# Altium schematic symbol library MCU_Microchip_ATmega.SchLib: 440 symbols (part 9 of 9)
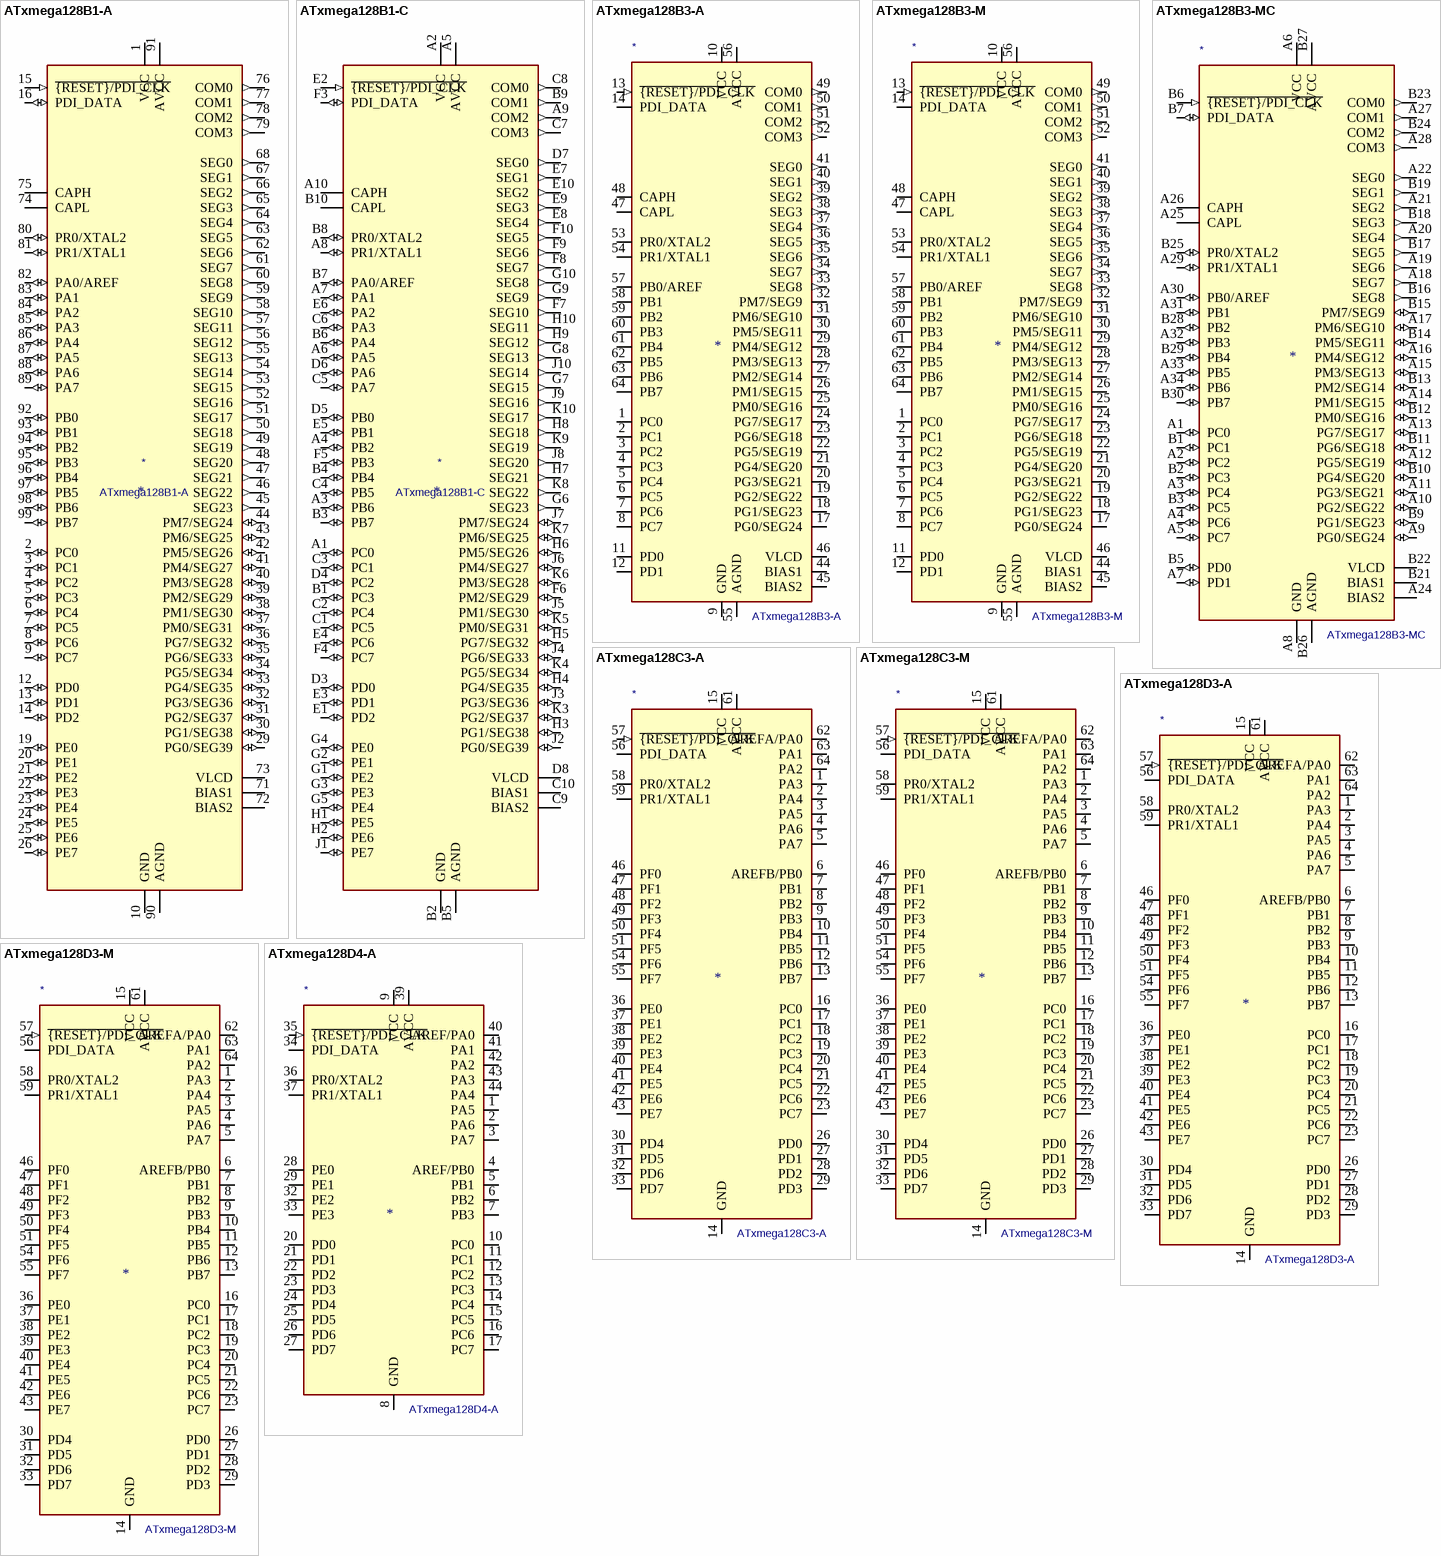
[diagram p48: symbols ATxmega128B1-A to ATxmega128D4-A]

## ATxmega128B3-A
designator *  value ATxmega128B3-A
ki_keywords: AVR 8/16bit Microcontroller XMegaAVR; ki_description: 32MHz, 128kB Flash, 8kB Boot, 8kB SRAM, 2kB EEPROM, JTAG, USB, LCD, TQFP-64; ki_fp_filters: TQFP*14x14mm*P0.8mm*; Footprint: Package_QFP:TQFP-64_14x14mm_P0.8mm; Supplier: http://ww1.microchip.com/downloads/en/DeviceDoc/Atmel-8074-8-and-16-bit-AVR-Microcontroller-XMEGA-B-ATxmega64B3-ATxmega128B3_Datasheet.pdf
footprint TQFP-64_14x14mm_P0.8mm
pins: 1 PC0 (io), 2 PC1 (io), 3 PC2 (io), 4 PC3 (io), 5 PC4 (io), 6 PC5 (io), 7 PC6 (io), 8 PC7 (io), 9 GND (power), 10 VCC (power), 11 PD0 (io), 12 PD1 (io), 13 ~{{RESET}/PDI_CLK} (in), 14 PDI_DATA (io), 15 GND hidden, 16 VCC hidden, 17 PG0/SEG24 (io), 18 PG1/SEG23 (io), 19 PG2/SEG22 (io), 20 PG3/SEG21 (io), 21 PG4/SEG20 (io), 22 PG5/SEG19 (io), 23 PG6/SEG18 (io), 24 PG7/SEG17 (io), 25 PM0/SEG16 (io), 26 PM1/SEG15 (io), 27 PM2/SEG14 (io), 28 PM3/SEG13 (io), 29 PM4/SEG12 (io), 30 PM5/SEG11 (io), 31 PM6/SEG10 (io), 32 PM7/SEG9 (io), 33 SEG8 (out), 34 SEG7 (out), 35 SEG6 (out), 36 SEG5 (out), 37 SEG4 (out), 38 SEG3 (out), 39 SEG2 (out), 40 SEG1 (out), 41 SEG0 (out), 42 GND hidden, 43 VCC hidden, 44 BIAS1 (power), 45 BIAS2 (power), 46 VLCD (power), 47 CAPL, 48 CAPH, 49 COM0 (out), 50 COM1 (out), 51 COM2 (out), 52 COM3 (out), 53 PR0/XTAL2 (io), 54 PR1/XTAL1 (io), 55 AGND (power), 56 AVCC (power), 57 PB0/AREF (io), 58 PB1 (io), 59 PB2 (io), 60 PB3 (io), 61 PB4 (io), 62 PB5 (io), 63 PB6 (io), 64 PB7 (io)

## ATxmega128B3-M
designator *  value ATxmega128B3-M
ki_keywords: AVR 8/16bit Microcontroller XMegaAVR; ki_description: 32MHz, 128kB Flash, 8kB Boot, 8kB SRAM, 2kB EEPROM, JTAG, USB, LCD, QFN-64; ki_fp_filters: QFN*1EP*9x9mm*P0.5mm*; Footprint: Package_DFN_QFN:QFN-64-1EP_9x9mm_P0.5mm_EP7.65x7.65mm; Supplier: http://ww1.microchip.com/downloads/en/DeviceDoc/Atmel-8074-8-and-16-bit-AVR-Microcontroller-XMEGA-B-ATxmega64B3-ATxmega128B3_Datasheet.pdf
footprint QFN-64-1EP_9x9mm_P0.5mm_EP7.65x7.65mm
pins: 1 PC0 (io), 2 PC1 (io), 3 PC2 (io), 4 PC3 (io), 5 PC4 (io), 6 PC5 (io), 7 PC6 (io), 8 PC7 (io), 9 GND (power), 10 VCC (power), 11 PD0 (io), 12 PD1 (io), 13 ~{{RESET}/PDI_CLK} (in), 14 PDI_DATA (io), 15 GND hidden, 16 VCC hidden, 17 PG0/SEG24 (io), 18 PG1/SEG23 (io), 19 PG2/SEG22 (io), 20 PG3/SEG21 (io), 21 PG4/SEG20 (io), 22 PG5/SEG19 (io), 23 PG6/SEG18 (io), 24 PG7/SEG17 (io), 25 PM0/SEG16 (io), 26 PM1/SEG15 (io), 27 PM2/SEG14 (io), 28 PM3/SEG13 (io), 29 PM4/SEG12 (io), 30 PM5/SEG11 (io), 31 PM6/SEG10 (io), 32 PM7/SEG9 (io), 33 SEG8 (out), 34 SEG7 (out), 35 SEG6 (out), 36 SEG5 (out), 37 SEG4 (out), 38 SEG3 (out), 39 SEG2 (out), 40 SEG1 (out), 41 SEG0 (out), 42 GND hidden, 43 VCC hidden, 44 BIAS1 (power), 45 BIAS2 (power), 46 VLCD (power), 47 CAPL, 48 CAPH, 49 COM0 (out), 50 COM1 (out), 51 COM2 (out), 52 COM3 (out), 53 PR0/XTAL2 (io), 54 PR1/XTAL1 (io), 55 AGND (power), 56 AVCC (power), 57 PB0/AREF (io), 58 PB1 (io), 59 PB2 (io), 60 PB3 (io), 61 PB4 (io), 62 PB5 (io), 63 PB6 (io), 64 PB7 (io), 65 GND hidden

## ATxmega128B3-MC
designator *  value ATxmega128B3-MC
ki_keywords: AVR 8/16bit Microcontroller XMegaAVR; ki_description: 32MHz, 128kB Flash, 8kB Boot, 8kB SRAM, 2kB EEPROM, JTAG, USB, LCD, DRQFN-64; ki_fp_filters: Microchip*DRQFN*1EP*7x7mm*P0.65mm*; Footprint: Package_DFN_QFN:Microchip_DRQFN-64-1EP_7x7mm_P0.65mm_EP4.1x4.1mm; Supplier: http://ww1.microchip.com/downloads/en/DeviceDoc/Atmel-8074-8-and-16-bit-AVR-Microcontroller-XMEGA-B-ATxmega64B3-ATxmega128B3_Datasheet.pdf
footprint Microchip_DRQFN-64-1EP_7x7mm_P0.65mm_EP4.1x4.1mm
pins: A1 PC0 (io), A2 PC2 (io), A3 PC4 (io), A4 PC6 (io), A5 PC7 (io), A6 VCC (power), A7 PD1 (io), A8 GND (power), A9 PG0/SEG24 (io), A10 PG2/SEG22 (io), A11 PG3/SEG21 (io), A12 PG5/SEG19 (io), A13 PG7/SEG17 (io), A14 PM1/SEG15 (io), A15 PM3/SEG13 (io), A16 PM4/SEG12 (io), A17 PM6/SEG10 (io), A18 SEG7 (out), A19 SEG6 (out), A20 SEG4 (out), A21 SEG2 (out), A22 SEG0 (out), A23 VCC hidden, A24 BIAS2 (power), A25 CAPL, A26 CAPH, A27 COM1 (out), A28 COM3 (out), A29 PR1/XTAL1 (io), A30 PB0/AREF (io), A31 PB1 (io), A32 PB3 (io), A33 PB5 (io), A34 PB6 (io), B1 PC1 (io), B2 PC3 (io), B3 PC5 (io), B4 GND hidden, B5 PD0 (io), B6 ~{{RESET}/PDI_CLK} (in), B7 PDI_DATA (io), B8 VCC hidden, B9 PG1/SEG23 (io), B10 PG4/SEG20 (io), B11 PG6/SEG18 (io), B12 PM0/SEG16 (io), B13 PM2/SEG14 (io), B14 PM5/SEG11 (io), B15 PM7/SEG9 (io), B16 SEG8 (out), B17 SEG5 (out), B18 SEG3 (out), B19 SEG1 (out), B20 GND hidden, B21 BIAS1 (power), B22 VLCD (power), B23 COM0 (out), B24 COM2 (out), B25 PR0/XTAL2 (io), B26 AGND (power), B27 AVCC (power), B28 PB2 (io), B29 PB4 (io), B30 PB7 (io), EP GND hidden

## ATxmega128C3-A
designator *  value ATxmega128C3-A
ki_keywords: AVR 8/16bit Microcontroller XMegaAVR; ki_description: 32MHz, 128kB Flash, 8kB Boot, 8kB SRAM, 2kB EEPROM, JTAG, USB, TQFP-64; ki_fp_filters: TQFP*14x14mm*P0.8mm*; Footprint: Package_QFP:TQFP-64_14x14mm_P0.8mm; Supplier: http://ww1.microchip.com/downloads/en/DeviceDoc/Atmel-8492-8-and-16-bit-AVR-microcontroller-ATxmega32C3_64C3_128C3_192C3_256C3_datasheet.pdf
footprint TQFP-64_14x14mm_P0.8mm
pins: 1 PA3 (io), 2 PA4 (io), 3 PA5 (io), 4 PA6 (io), 5 PA7 (io), 6 AREFB/PB0 (io), 7 PB1 (io), 8 PB2 (io), 9 PB3 (io), 10 PB4 (io), 11 PB5 (io), 12 PB6 (io), 13 PB7 (io), 14 GND (power), 15 VCC (power), 16 PC0 (io), 17 PC1 (io), 18 PC2 (io), 19 PC3 (io), 20 PC4 (io), 21 PC5 (io), 22 PC6 (io), 23 PC7 (io), 24 GND hidden, 25 VCC hidden, 26 PD0 (io), 27 PD1 (io), 28 PD2 (io), 29 PD3 (io), 30 PD4 (io), 31 PD5 (io), 32 PD6 (io), 33 PD7 (io), 34 GND hidden, 35 VCC hidden, 36 PE0 (io), 37 PE1 (io), 38 PE2 (io), 39 PE3 (io), 40 PE4 (io), 41 PE5 (io), 42 PE6 (io), 43 PE7 (io), 44 GND hidden, 45 VCC hidden, 46 PF0 (io), 47 PF1 (io), 48 PF2 (io), 49 PF3 (io), 50 PF4 (io), 51 PF5 (io), 52 GND hidden, 53 VCC hidden, 54 PF6 (io), 55 PF7 (io), 56 PDI_DATA (io), 57 ~{{RESET}/PDI_CLK} (in), 58 PR0/XTAL2 (io), 59 PR1/XTAL1 (io), 60 GND hidden, 61 AVCC (power), 62 AREFA/PA0 (io), 63 PA1 (io), 64 PA2 (io)

## ATxmega128C3-M
designator *  value ATxmega128C3-M
ki_keywords: AVR 8/16bit Microcontroller XMegaAVR; ki_description: 32MHz, 128kB Flash, 8kB Boot, 8kB SRAM, 2kB EEPROM, JTAG, USB, QFN-64; ki_fp_filters: QFN*1EP*9x9mm*P0.5mm*; Footprint: Package_DFN_QFN:QFN-64-1EP_9x9mm_P0.5mm_EP7.65x7.65mm; Supplier: http://ww1.microchip.com/downloads/en/DeviceDoc/Atmel-8492-8-and-16-bit-AVR-microcontroller-ATxmega32C3_64C3_128C3_192C3_256C3_datasheet.pdf
footprint QFN-64-1EP_9x9mm_P0.5mm_EP7.65x7.65mm
pins: 1 PA3 (io), 2 PA4 (io), 3 PA5 (io), 4 PA6 (io), 5 PA7 (io), 6 AREFB/PB0 (io), 7 PB1 (io), 8 PB2 (io), 9 PB3 (io), 10 PB4 (io), 11 PB5 (io), 12 PB6 (io), 13 PB7 (io), 14 GND (power), 15 VCC (power), 16 PC0 (io), 17 PC1 (io), 18 PC2 (io), 19 PC3 (io), 20 PC4 (io), 21 PC5 (io), 22 PC6 (io), 23 PC7 (io), 24 GND hidden, 25 VCC hidden, 26 PD0 (io), 27 PD1 (io), 28 PD2 (io), 29 PD3 (io), 30 PD4 (io), 31 PD5 (io), 32 PD6 (io), 33 PD7 (io), 34 GND hidden, 35 VCC hidden, 36 PE0 (io), 37 PE1 (io), 38 PE2 (io), 39 PE3 (io), 40 PE4 (io), 41 PE5 (io), 42 PE6 (io), 43 PE7 (io), 44 GND hidden, 45 VCC hidden, 46 PF0 (io), 47 PF1 (io), 48 PF2 (io), 49 PF3 (io), 50 PF4 (io), 51 PF5 (io), 52 GND hidden, 53 VCC hidden, 54 PF6 (io), 55 PF7 (io), 56 PDI_DATA (io), 57 ~{{RESET}/PDI_CLK} (in), 58 PR0/XTAL2 (io), 59 PR1/XTAL1 (io), 60 GND hidden, 61 AVCC (power), 62 AREFA/PA0 (io), 63 PA1 (io), 64 PA2 (io), 65 GND hidden

## ATxmega128D3-A
designator *  value ATxmega128D3-A
ki_keywords: AVR 8/16bit Microcontroller XMegaAVR; ki_description: 32MHz, 128kB Flash, 8kB Boot, 8kB SRAM, 2kB EEPROM, JTAG, TQFP-64; ki_fp_filters: TQFP*14x14mm*P0.8mm*; Footprint: Package_QFP:TQFP-64_14x14mm_P0.8mm; Supplier: http://ww1.microchip.com/downloads/en/DeviceDoc/Atmel-8134-8-16-bit-Atmel-XMEGA-D3-Microcontroller_Datasheet.pdf
footprint TQFP-64_14x14mm_P0.8mm
pins: 1 PA3 (io), 2 PA4 (io), 3 PA5 (io), 4 PA6 (io), 5 PA7 (io), 6 AREFB/PB0 (io), 7 PB1 (io), 8 PB2 (io), 9 PB3 (io), 10 PB4 (io), 11 PB5 (io), 12 PB6 (io), 13 PB7 (io), 14 GND (power), 15 VCC (power), 16 PC0 (io), 17 PC1 (io), 18 PC2 (io), 19 PC3 (io), 20 PC4 (io), 21 PC5 (io), 22 PC6 (io), 23 PC7 (io), 24 GND hidden, 25 VCC hidden, 26 PD0 (io), 27 PD1 (io), 28 PD2 (io), 29 PD3 (io), 30 PD4 (io), 31 PD5 (io), 32 PD6 (io), 33 PD7 (io), 34 GND hidden, 35 VCC hidden, 36 PE0 (io), 37 PE1 (io), 38 PE2 (io), 39 PE3 (io), 40 PE4 (io), 41 PE5 (io), 42 PE6 (io), 43 PE7 (io), 44 GND hidden, 45 VCC hidden, 46 PF0 (io), 47 PF1 (io), 48 PF2 (io), 49 PF3 (io), 50 PF4 (io), 51 PF5 (io), 52 GND hidden, 53 VCC hidden, 54 PF6 (io), 55 PF7 (io), 56 PDI_DATA (io), 57 ~{{RESET}/PDI_CLK} (in), 58 PR0/XTAL2 (io), 59 PR1/XTAL1 (io), 60 GND hidden, 61 AVCC (power), 62 AREFA/PA0 (io), 63 PA1 (io), 64 PA2 (io)

## ATxmega128D3-M
designator *  value ATxmega128D3-M
ki_keywords: AVR 8/16bit Microcontroller XMegaAVR; ki_description: 32MHz, 128kB Flash, 8kB Boot, 8kB SRAM, 2kB EEPROM, JTAG, QFN-64; ki_fp_filters: QFN*1EP*9x9mm*P0.5mm*; Footprint: Package_DFN_QFN:QFN-64-1EP_9x9mm_P0.5mm_EP7.65x7.65mm; Supplier: http://ww1.microchip.com/downloads/en/DeviceDoc/Atmel-8134-8-16-bit-Atmel-XMEGA-D3-Microcontroller_Datasheet.pdf
footprint QFN-64-1EP_9x9mm_P0.5mm_EP7.65x7.65mm
pins: 1 PA3 (io), 2 PA4 (io), 3 PA5 (io), 4 PA6 (io), 5 PA7 (io), 6 AREFB/PB0 (io), 7 PB1 (io), 8 PB2 (io), 9 PB3 (io), 10 PB4 (io), 11 PB5 (io), 12 PB6 (io), 13 PB7 (io), 14 GND (power), 15 VCC (power), 16 PC0 (io), 17 PC1 (io), 18 PC2 (io), 19 PC3 (io), 20 PC4 (io), 21 PC5 (io), 22 PC6 (io), 23 PC7 (io), 24 GND hidden, 25 VCC hidden, 26 PD0 (io), 27 PD1 (io), 28 PD2 (io), 29 PD3 (io), 30 PD4 (io), 31 PD5 (io), 32 PD6 (io), 33 PD7 (io), 34 GND hidden, 35 VCC hidden, 36 PE0 (io), 37 PE1 (io), 38 PE2 (io), 39 PE3 (io), 40 PE4 (io), 41 PE5 (io), 42 PE6 (io), 43 PE7 (io), 44 GND hidden, 45 VCC hidden, 46 PF0 (io), 47 PF1 (io), 48 PF2 (io), 49 PF3 (io), 50 PF4 (io), 51 PF5 (io), 52 GND hidden, 53 VCC hidden, 54 PF6 (io), 55 PF7 (io), 56 PDI_DATA (io), 57 ~{{RESET}/PDI_CLK} (in), 58 PR0/XTAL2 (io), 59 PR1/XTAL1 (io), 60 GND hidden, 61 AVCC (power), 62 AREFA/PA0 (io), 63 PA1 (io), 64 PA2 (io), 65 GND hidden

## ATxmega128D4-A
designator *  value ATxmega128D4-A
ki_keywords: AVR 8/16bit Microcontroller XMegaAVR; ki_description: 32MHz, 128kB Flash, 8kB Boot, 8kB SRAM, 2kB EEPROM, JTAG, TQFP-44; ki_fp_filters: TQFP*10x10mm*P0.8mm*; Footprint: Package_QFP:TQFP-44_10x10mm_P0.8mm; Supplier: http://ww1.microchip.com/downloads/en/DeviceDoc/Atmel-8135-8-and-16-bit-AVR-microcontroller-ATxmega16D4-32D4-64D4-128D4_datasheet.pdf
footprint TQFP-44_10x10mm_P0.8mm
pins: 1 PA5 (io), 2 PA6 (io), 3 PA7 (io), 4 AREF/PB0 (io), 5 PB1 (io), 6 PB2 (io), 7 PB3 (io), 8 GND (power), 9 VCC (power), 10 PC0 (io), 11 PC1 (io), 12 PC2 (io), 13 PC3 (io), 14 PC4 (io), 15 PC5 (io), 16 PC6 (io), 17 PC7 (io), 18 GND hidden, 19 VCC hidden, 20 PD0 (io), 21 PD1 (io), 22 PD2 (io), 23 PD3 (io), 24 PD4 (io), 25 PD5 (io), 26 PD6 (io), 27 PD7 (io), 28 PE0 (io), 29 PE1 (io), 30 GND hidden, 31 VCC hidden, 32 PE2 (io), 33 PE3 (io), 34 PDI_DATA (io), 35 ~{{RESET}/PDI_CLK} (in), 36 PR0/XTAL2 (io), 37 PR1/XTAL1 (io), 38 GND hidden, 39 AVCC (power), 40 AREF/PA0 (io), 41 PA1 (io), 42 PA2 (io), 43 PA3 (io), 44 PA4 (io)

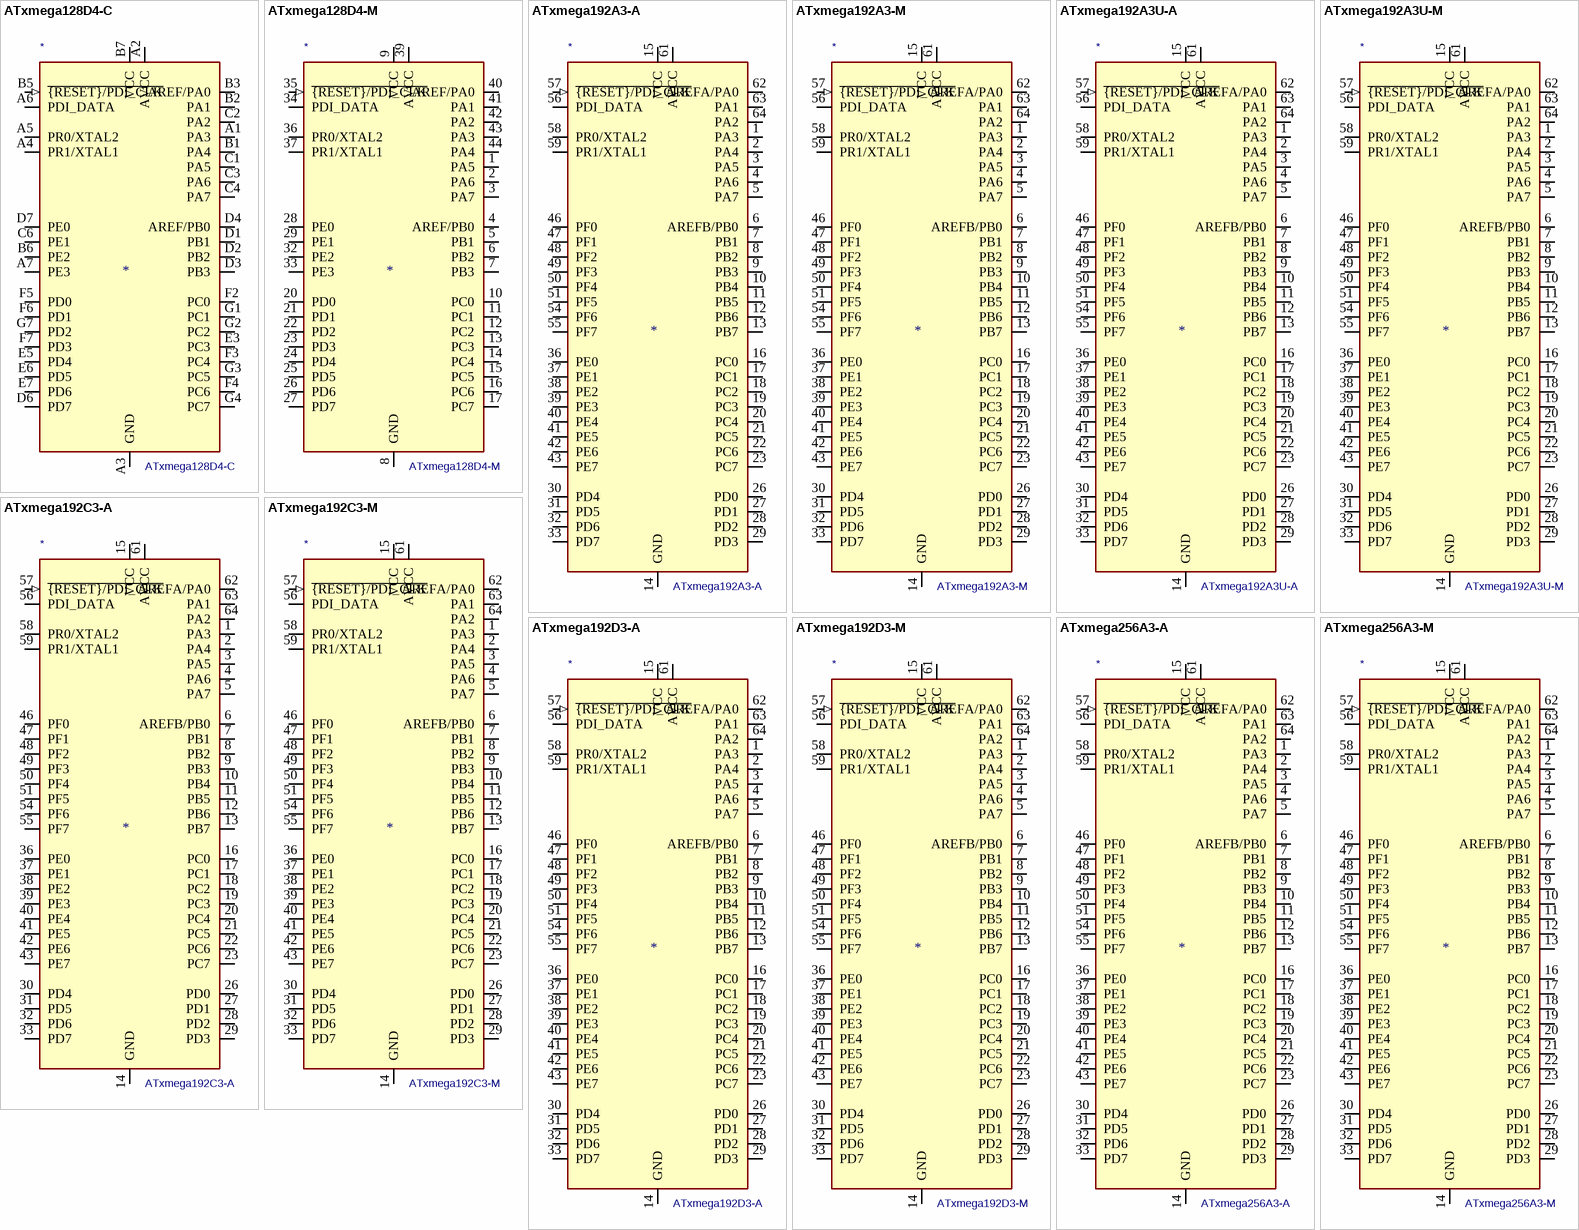
[diagram p38: symbols ATxmega128D4-C to ATxmega256A3-M]

## ATxmega128D4-C
designator *  value ATxmega128D4-C
ki_keywords: AVR 8/16bit Microcontroller XMegaAVR; ki_description: 32MHz, 128kB Flash, 8kB Boot, 8kB SRAM, 2kB EEPROM, JTAG, VFBGA-49; ki_fp_filters: VFBGA*5.0x5.0mm*Layout7x7*P0.65mm*; Footprint: Package_BGA:VFBGA-49_5.0x5.0mm_Layout7x7_P0.65mm; Supplier: http://ww1.microchip.com/downloads/en/DeviceDoc/Atmel-8135-8-and-16-bit-AVR-microcontroller-ATxmega16D4-32D4-64D4-128D4_datasheet.pdf
footprint VFBGA-49_5.0x5.0mm_Layout7x7_P0.65mm
pins: A1 PA3 (io), A2 AVCC (power), A3 GND (power), A4 PR1/XTAL1 (io), A5 PR0/XTAL2 (io), A6 PDI_DATA (io), A7 PE3 (io), B1 PA4 (io), B2 PA1 (io), B3 AREF/PA0 (io), B4 GND hidden, B5 ~{{RESET}/PDI_CLK} (in), B6 PE2 (io), B7 VCC (power), C1 PA5 (io), C2 PA2 (io), C3 PA6 (io), C4 PA7 (io), C5 GND hidden, C6 PE1 (io), C7 GND hidden, D1 PB1 (io), D2 PB2 (io), D3 PB3 (io), D4 AREF/PB0 (io), D5 GND hidden, D6 PD7 (io), D7 PE0 (io), E1 GND hidden, E2 GND hidden, E3 PC3 (io), E4 GND hidden, E5 PD4 (io), E6 PD5 (io), E7 PD6 (io), F1 VCC hidden, F2 PC0 (io), F3 PC4 (io), F4 PC6 (io), F5 PD0 (io), F6 PD1 (io), F7 PD3 (io), G1 PC1 (io), G2 PC2 (io), G3 PC5 (io), G4 PC7 (io), G5 GND hidden, G6 VCC hidden, G7 PD2 (io)

## ATxmega128D4-M
designator *  value ATxmega128D4-M
ki_keywords: AVR 8/16bit Microcontroller XMegaAVR; ki_description: 32MHz, 128kB Flash, 8kB Boot, 8kB SRAM, 2kB EEPROM, JTAG, QFN-44; ki_fp_filters: QFN*1EP*7x7mm*P0.5mm*; Footprint: Package_DFN_QFN:QFN-44-1EP_7x7mm_P0.5mm_EP5.2x5.2mm; Supplier: http://ww1.microchip.com/downloads/en/DeviceDoc/Atmel-8135-8-and-16-bit-AVR-microcontroller-ATxmega16D4-32D4-64D4-128D4_datasheet.pdf
footprint QFN-44-1EP_7x7mm_P0.5mm_EP5.2x5.2mm
pins: 1 PA5 (io), 2 PA6 (io), 3 PA7 (io), 4 AREF/PB0 (io), 5 PB1 (io), 6 PB2 (io), 7 PB3 (io), 8 GND (power), 9 VCC (power), 10 PC0 (io), 11 PC1 (io), 12 PC2 (io), 13 PC3 (io), 14 PC4 (io), 15 PC5 (io), 16 PC6 (io), 17 PC7 (io), 18 GND hidden, 19 VCC hidden, 20 PD0 (io), 21 PD1 (io), 22 PD2 (io), 23 PD3 (io), 24 PD4 (io), 25 PD5 (io), 26 PD6 (io), 27 PD7 (io), 28 PE0 (io), 29 PE1 (io), 30 GND hidden, 31 VCC hidden, 32 PE2 (io), 33 PE3 (io), 34 PDI_DATA (io), 35 ~{{RESET}/PDI_CLK} (in), 36 PR0/XTAL2 (io), 37 PR1/XTAL1 (io), 38 GND hidden, 39 AVCC (power), 40 AREF/PA0 (io), 41 PA1 (io), 42 PA2 (io), 43 PA3 (io), 44 PA4 (io), 45 GND hidden

## ATxmega192A3-A
designator *  value ATxmega192A3-A
ki_keywords: AVR 8/16bit Microcontroller XMegaAVR; ki_description: 32MHz, 192kB Flash, 8kB Boot, 16kB SRAM, 2kB EEPROM, JTAG, TQFP-64; ki_fp_filters: TQFP*14x14mm*P0.8mm*; Footprint: Package_QFP:TQFP-64_14x14mm_P0.8mm; Supplier: http://ww1.microchip.com/downloads/en/DeviceDoc/Atmel-8068-8-and16-bit-AVR-XMEGA-A3-Microcontrollers_Datasheet.pdf
footprint TQFP-64_14x14mm_P0.8mm
pins: 1 PA3 (io), 2 PA4 (io), 3 PA5 (io), 4 PA6 (io), 5 PA7 (io), 6 AREFB/PB0 (io), 7 PB1 (io), 8 PB2 (io), 9 PB3 (io), 10 PB4 (io), 11 PB5 (io), 12 PB6 (io), 13 PB7 (io), 14 GND (power), 15 VCC (power), 16 PC0 (io), 17 PC1 (io), 18 PC2 (io), 19 PC3 (io), 20 PC4 (io), 21 PC5 (io), 22 PC6 (io), 23 PC7 (io), 24 GND hidden, 25 VCC hidden, 26 PD0 (io), 27 PD1 (io), 28 PD2 (io), 29 PD3 (io), 30 PD4 (io), 31 PD5 (io), 32 PD6 (io), 33 PD7 (io), 34 GND hidden, 35 VCC hidden, 36 PE0 (io), 37 PE1 (io), 38 PE2 (io), 39 PE3 (io), 40 PE4 (io), 41 PE5 (io), 42 PE6 (io), 43 PE7 (io), 44 GND hidden, 45 VCC hidden, 46 PF0 (io), 47 PF1 (io), 48 PF2 (io), 49 PF3 (io), 50 PF4 (io), 51 PF5 (io), 52 GND hidden, 53 VCC hidden, 54 PF6 (io), 55 PF7 (io), 56 PDI_DATA (io), 57 ~{{RESET}/PDI_CLK} (in), 58 PR0/XTAL2 (io), 59 PR1/XTAL1 (io), 60 GND hidden, 61 AVCC (power), 62 AREFA/PA0 (io), 63 PA1 (io), 64 PA2 (io)

## ATxmega192A3-M
designator *  value ATxmega192A3-M
ki_keywords: AVR 8/16bit Microcontroller XMegaAVR; ki_description: 32MHz, 192kB Flash, 8kB Boot, 16kB SRAM, 2kB EEPROM, JTAG, QFN-64; ki_fp_filters: QFN*1EP*9x9mm*P0.5mm*; Footprint: Package_DFN_QFN:QFN-64-1EP_9x9mm_P0.5mm_EP7.65x7.65mm; Supplier: http://ww1.microchip.com/downloads/en/DeviceDoc/Atmel-8068-8-and16-bit-AVR-XMEGA-A3-Microcontrollers_Datasheet.pdf
footprint QFN-64-1EP_9x9mm_P0.5mm_EP7.65x7.65mm
pins: 1 PA3 (io), 2 PA4 (io), 3 PA5 (io), 4 PA6 (io), 5 PA7 (io), 6 AREFB/PB0 (io), 7 PB1 (io), 8 PB2 (io), 9 PB3 (io), 10 PB4 (io), 11 PB5 (io), 12 PB6 (io), 13 PB7 (io), 14 GND (power), 15 VCC (power), 16 PC0 (io), 17 PC1 (io), 18 PC2 (io), 19 PC3 (io), 20 PC4 (io), 21 PC5 (io), 22 PC6 (io), 23 PC7 (io), 24 GND hidden, 25 VCC hidden, 26 PD0 (io), 27 PD1 (io), 28 PD2 (io), 29 PD3 (io), 30 PD4 (io), 31 PD5 (io), 32 PD6 (io), 33 PD7 (io), 34 GND hidden, 35 VCC hidden, 36 PE0 (io), 37 PE1 (io), 38 PE2 (io), 39 PE3 (io), 40 PE4 (io), 41 PE5 (io), 42 PE6 (io), 43 PE7 (io), 44 GND hidden, 45 VCC hidden, 46 PF0 (io), 47 PF1 (io), 48 PF2 (io), 49 PF3 (io), 50 PF4 (io), 51 PF5 (io), 52 GND hidden, 53 VCC hidden, 54 PF6 (io), 55 PF7 (io), 56 PDI_DATA (io), 57 ~{{RESET}/PDI_CLK} (in), 58 PR0/XTAL2 (io), 59 PR1/XTAL1 (io), 60 GND hidden, 61 AVCC (power), 62 AREFA/PA0 (io), 63 PA1 (io), 64 PA2 (io), 65 GND hidden

## ATxmega192A3U-A
designator *  value ATxmega192A3U-A
ki_keywords: AVR 8/16bit Microcontroller XMegaAVR; ki_description: 32MHz, 192kB Flash, 8kB Boot, 16kB SRAM, 2kB EEPROM, JTAG, USB, TQFP-64; ki_fp_filters: TQFP*14x14mm*P0.8mm*; Footprint: Package_QFP:TQFP-64_14x14mm_P0.8mm; Supplier: http://ww1.microchip.com/downloads/en/DeviceDoc/Atmel-8386-8-and-16-bit-AVR-Microcontroller-ATxmega64A3U-128A3U-192A3U-256A3U_datasheet.pdf
footprint TQFP-64_14x14mm_P0.8mm
pins: 1 PA3 (io), 2 PA4 (io), 3 PA5 (io), 4 PA6 (io), 5 PA7 (io), 6 AREFB/PB0 (io), 7 PB1 (io), 8 PB2 (io), 9 PB3 (io), 10 PB4 (io), 11 PB5 (io), 12 PB6 (io), 13 PB7 (io), 14 GND (power), 15 VCC (power), 16 PC0 (io), 17 PC1 (io), 18 PC2 (io), 19 PC3 (io), 20 PC4 (io), 21 PC5 (io), 22 PC6 (io), 23 PC7 (io), 24 GND hidden, 25 VCC hidden, 26 PD0 (io), 27 PD1 (io), 28 PD2 (io), 29 PD3 (io), 30 PD4 (io), 31 PD5 (io), 32 PD6 (io), 33 PD7 (io), 34 GND hidden, 35 VCC hidden, 36 PE0 (io), 37 PE1 (io), 38 PE2 (io), 39 PE3 (io), 40 PE4 (io), 41 PE5 (io), 42 PE6 (io), 43 PE7 (io), 44 GND hidden, 45 VCC hidden, 46 PF0 (io), 47 PF1 (io), 48 PF2 (io), 49 PF3 (io), 50 PF4 (io), 51 PF5 (io), 52 GND hidden, 53 VCC hidden, 54 PF6 (io), 55 PF7 (io), 56 PDI_DATA (io), 57 ~{{RESET}/PDI_CLK} (in), 58 PR0/XTAL2 (io), 59 PR1/XTAL1 (io), 60 GND hidden, 61 AVCC (power), 62 AREFA/PA0 (io), 63 PA1 (io), 64 PA2 (io)

## ATxmega192A3U-M
designator *  value ATxmega192A3U-M
ki_keywords: AVR 8/16bit Microcontroller XMegaAVR; ki_description: 32MHz, 192kB Flash, 8kB Boot, 16kB SRAM, 2kB EEPROM, JTAG, USB, QFN-64; ki_fp_filters: QFN*1EP*9x9mm*P0.5mm*; Footprint: Package_DFN_QFN:QFN-64-1EP_9x9mm_P0.5mm_EP7.65x7.65mm; Supplier: http://ww1.microchip.com/downloads/en/DeviceDoc/Atmel-8386-8-and-16-bit-AVR-Microcontroller-ATxmega64A3U-128A3U-192A3U-256A3U_datasheet.pdf
footprint QFN-64-1EP_9x9mm_P0.5mm_EP7.65x7.65mm
pins: 1 PA3 (io), 2 PA4 (io), 3 PA5 (io), 4 PA6 (io), 5 PA7 (io), 6 AREFB/PB0 (io), 7 PB1 (io), 8 PB2 (io), 9 PB3 (io), 10 PB4 (io), 11 PB5 (io), 12 PB6 (io), 13 PB7 (io), 14 GND (power), 15 VCC (power), 16 PC0 (io), 17 PC1 (io), 18 PC2 (io), 19 PC3 (io), 20 PC4 (io), 21 PC5 (io), 22 PC6 (io), 23 PC7 (io), 24 GND hidden, 25 VCC hidden, 26 PD0 (io), 27 PD1 (io), 28 PD2 (io), 29 PD3 (io), 30 PD4 (io), 31 PD5 (io), 32 PD6 (io), 33 PD7 (io), 34 GND hidden, 35 VCC hidden, 36 PE0 (io), 37 PE1 (io), 38 PE2 (io), 39 PE3 (io), 40 PE4 (io), 41 PE5 (io), 42 PE6 (io), 43 PE7 (io), 44 GND hidden, 45 VCC hidden, 46 PF0 (io), 47 PF1 (io), 48 PF2 (io), 49 PF3 (io), 50 PF4 (io), 51 PF5 (io), 52 GND hidden, 53 VCC hidden, 54 PF6 (io), 55 PF7 (io), 56 PDI_DATA (io), 57 ~{{RESET}/PDI_CLK} (in), 58 PR0/XTAL2 (io), 59 PR1/XTAL1 (io), 60 GND hidden, 61 AVCC (power), 62 AREFA/PA0 (io), 63 PA1 (io), 64 PA2 (io), 65 GND hidden

## ATxmega192C3-A
designator *  value ATxmega192C3-A
ki_keywords: AVR 8/16bit Microcontroller XMegaAVR; ki_description: 32MHz, 192kB Flash, 8kB Boot, 16kB SRAM, 2kB EEPROM, JTAG, USB, TQFP-64; ki_fp_filters: TQFP*14x14mm*P0.8mm*; Footprint: Package_QFP:TQFP-64_14x14mm_P0.8mm; Supplier: http://ww1.microchip.com/downloads/en/DeviceDoc/Atmel-8492-8-and-16-bit-AVR-microcontroller-ATxmega32C3_64C3_128C3_192C3_256C3_datasheet.pdf
footprint TQFP-64_14x14mm_P0.8mm
pins: 1 PA3 (io), 2 PA4 (io), 3 PA5 (io), 4 PA6 (io), 5 PA7 (io), 6 AREFB/PB0 (io), 7 PB1 (io), 8 PB2 (io), 9 PB3 (io), 10 PB4 (io), 11 PB5 (io), 12 PB6 (io), 13 PB7 (io), 14 GND (power), 15 VCC (power), 16 PC0 (io), 17 PC1 (io), 18 PC2 (io), 19 PC3 (io), 20 PC4 (io), 21 PC5 (io), 22 PC6 (io), 23 PC7 (io), 24 GND hidden, 25 VCC hidden, 26 PD0 (io), 27 PD1 (io), 28 PD2 (io), 29 PD3 (io), 30 PD4 (io), 31 PD5 (io), 32 PD6 (io), 33 PD7 (io), 34 GND hidden, 35 VCC hidden, 36 PE0 (io), 37 PE1 (io), 38 PE2 (io), 39 PE3 (io), 40 PE4 (io), 41 PE5 (io), 42 PE6 (io), 43 PE7 (io), 44 GND hidden, 45 VCC hidden, 46 PF0 (io), 47 PF1 (io), 48 PF2 (io), 49 PF3 (io), 50 PF4 (io), 51 PF5 (io), 52 GND hidden, 53 VCC hidden, 54 PF6 (io), 55 PF7 (io), 56 PDI_DATA (io), 57 ~{{RESET}/PDI_CLK} (in), 58 PR0/XTAL2 (io), 59 PR1/XTAL1 (io), 60 GND hidden, 61 AVCC (power), 62 AREFA/PA0 (io), 63 PA1 (io), 64 PA2 (io)

## ATxmega192C3-M
designator *  value ATxmega192C3-M
ki_keywords: AVR 8/16bit Microcontroller XMegaAVR; ki_description: 32MHz, 192kB Flash, 8kB Boot, 16kB SRAM, 2kB EEPROM, JTAG, USB, QFN-64; ki_fp_filters: QFN*1EP*9x9mm*P0.5mm*; Footprint: Package_DFN_QFN:QFN-64-1EP_9x9mm_P0.5mm_EP7.65x7.65mm; Supplier: http://ww1.microchip.com/downloads/en/DeviceDoc/Atmel-8492-8-and-16-bit-AVR-microcontroller-ATxmega32C3_64C3_128C3_192C3_256C3_datasheet.pdf
footprint QFN-64-1EP_9x9mm_P0.5mm_EP7.65x7.65mm
pins: 1 PA3 (io), 2 PA4 (io), 3 PA5 (io), 4 PA6 (io), 5 PA7 (io), 6 AREFB/PB0 (io), 7 PB1 (io), 8 PB2 (io), 9 PB3 (io), 10 PB4 (io), 11 PB5 (io), 12 PB6 (io), 13 PB7 (io), 14 GND (power), 15 VCC (power), 16 PC0 (io), 17 PC1 (io), 18 PC2 (io), 19 PC3 (io), 20 PC4 (io), 21 PC5 (io), 22 PC6 (io), 23 PC7 (io), 24 GND hidden, 25 VCC hidden, 26 PD0 (io), 27 PD1 (io), 28 PD2 (io), 29 PD3 (io), 30 PD4 (io), 31 PD5 (io), 32 PD6 (io), 33 PD7 (io), 34 GND hidden, 35 VCC hidden, 36 PE0 (io), 37 PE1 (io), 38 PE2 (io), 39 PE3 (io), 40 PE4 (io), 41 PE5 (io), 42 PE6 (io), 43 PE7 (io), 44 GND hidden, 45 VCC hidden, 46 PF0 (io), 47 PF1 (io), 48 PF2 (io), 49 PF3 (io), 50 PF4 (io), 51 PF5 (io), 52 GND hidden, 53 VCC hidden, 54 PF6 (io), 55 PF7 (io), 56 PDI_DATA (io), 57 ~{{RESET}/PDI_CLK} (in), 58 PR0/XTAL2 (io), 59 PR1/XTAL1 (io), 60 GND hidden, 61 AVCC (power), 62 AREFA/PA0 (io), 63 PA1 (io), 64 PA2 (io), 65 GND hidden